# Altium footprint library HW_HOLLAND_NCDM_MONITOR_R1.PcbLib: 472 footprints (part 7 of 30)
Each footprint in its own frame and in the unit in brackets; x right, y up, seen from the top. Pads: shape width x height; smd on the part's side, far side on the other; paste and mask are expansions set on the pad; w line width, h text height; cw(c..) or ccw(c..) is an arc to the next point about the centre after c.
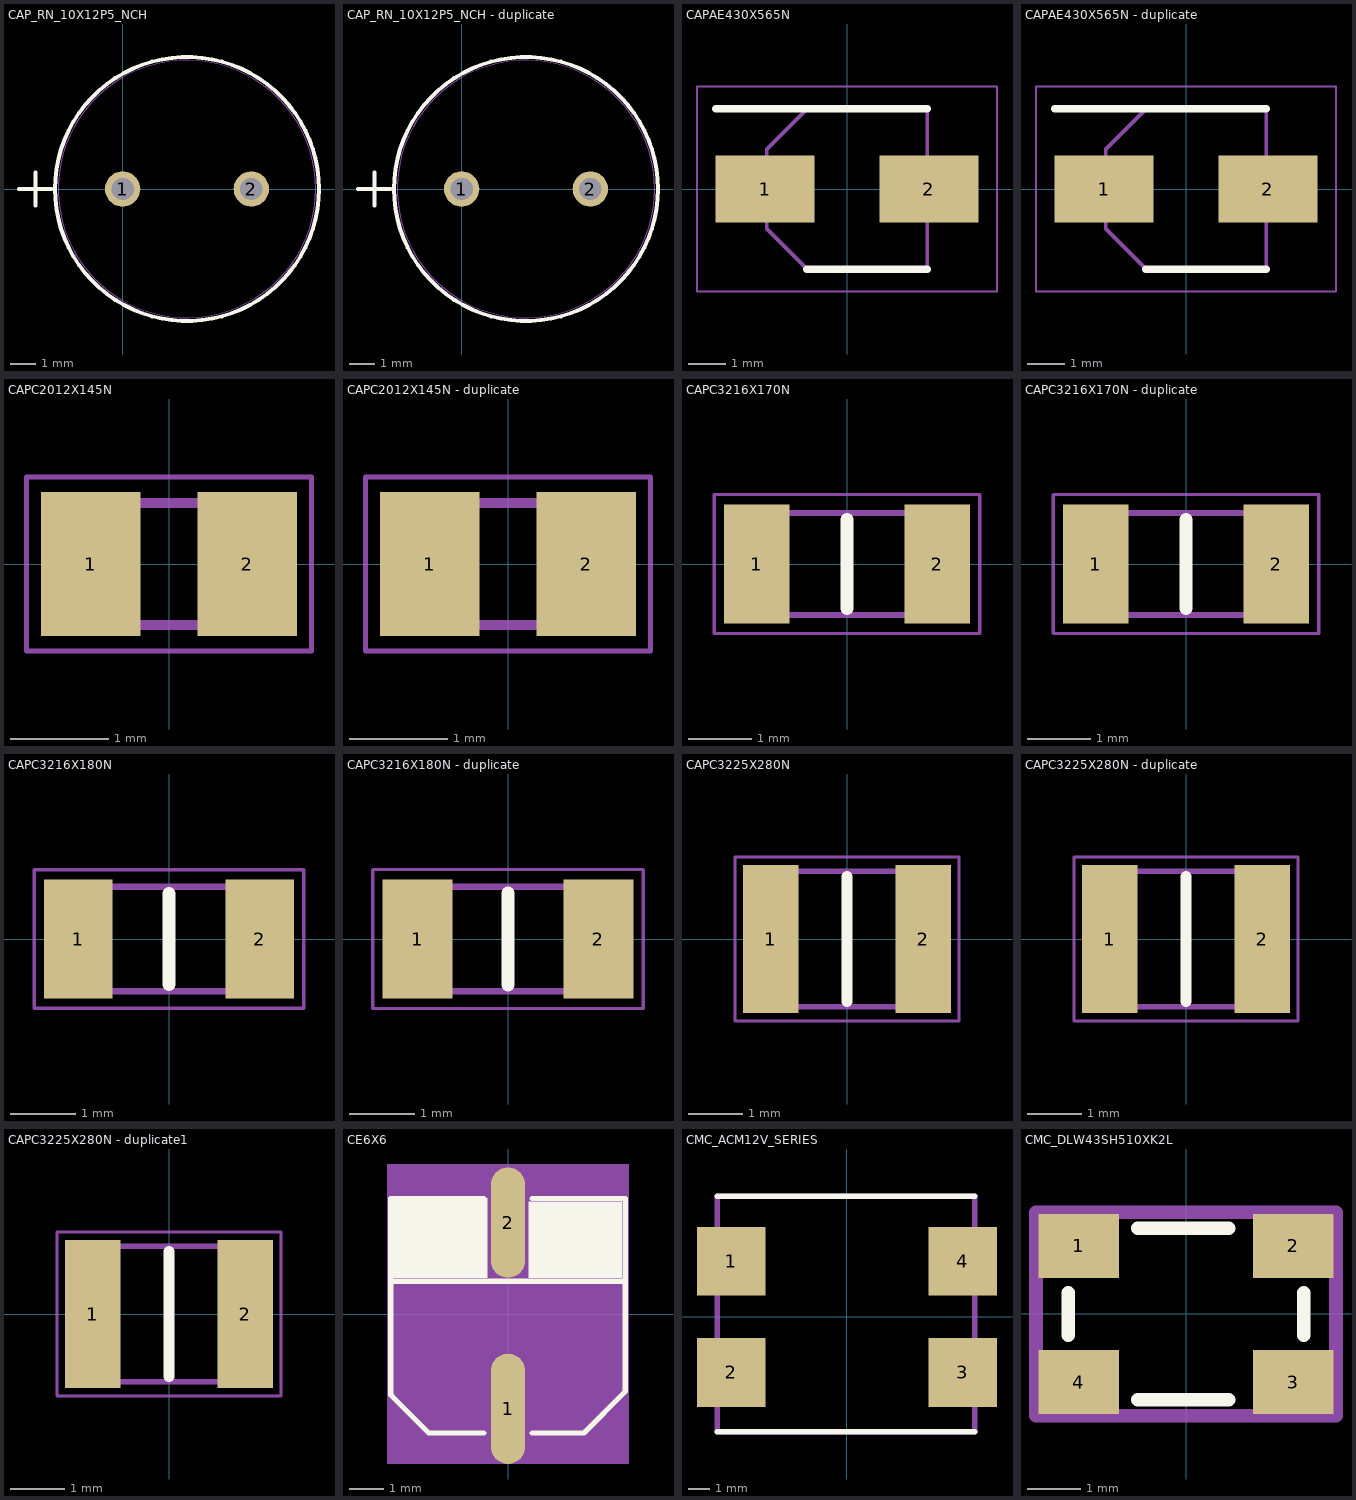
[diagram p6: the footprints below, top view; thin cyan lines are the x and y axes]

## CAP_RN_10X12P5_NCH [mil]
pads (2):
  round 54 hole 34 mask+0: 1(0,0) 2(196.85,0)
Top Overlay:
  circle w6: c98.43,0 r202
  lines w6: -158.57,0 -108.57,0 ; -133.57,-25 -133.57,25
Mechanical 13:
  circle w0: c98.43,0 r197
  lines w1: -158.57,0 -108.57,0 ; -133.57,-25 -133.57,25
3D body "UVY1H221MPD1TD.STEP": height 551.18, standoff -748.03, extent -98.42,-196.84 295.28,196.86

## CAP_RN_10X12P5_NCH - duplicate [mil]
pads (2):
  round 54 hole 34 mask+0: 1(0,0) 2(196.85,0)
Top Overlay:
  circle w6: c98.43,0 r202
  lines w6: -158.57,0 -108.57,0 ; -133.57,-25 -133.57,25
Mechanical 13:
  circle w0: c98.43,0 r197
  lines w1: -158.57,0 -108.57,0 ; -133.57,-25 -133.57,25
3D body "UVY1H221MPD1TD.STEP": height 551.18, standoff -748.03, extent -98.42,-196.84 295.28,196.86

## CAPAE430X565N [mm]
pads (2):
  rect 2.65x1.8 smd: 1(-2.2,0) 2(2.2,0)
Top Overlay:
  lines w0.2: -3.525,2.15 2.15,2.15 ; -1.075,-2.15 2.15,-2.15
Mechanical 13:
  lines w0.1: -2.15,-1.075 -1.075,-2.15 2.15,-2.15 2.15,2.15 -1.075,2.15 -2.15,1.075 -2.15,-1.075
Mechanical 15:
  lines w0.05: -4.025,-2.75 -4.025,2.75 4.025,2.75 4.025,-2.75 -4.025,-2.75
3D body "EDH106M016A9BAA.stp": height 5.66, standoff 0, extent -2.9,-2.3 2.3,2.2

## CAPAE430X565N - duplicate [mm]
pads (2):
  rect 2.65x1.8 smd: 1(-2.2,0) 2(2.2,0)
Top Overlay:
  lines w0.2: -3.525,2.15 2.15,2.15 ; -1.075,-2.15 2.15,-2.15
Mechanical 13:
  lines w0.1: -2.15,-1.075 -1.075,-2.15 2.15,-2.15 2.15,2.15 -1.075,2.15 -2.15,1.075 -2.15,-1.075
Mechanical 15:
  lines w0.05: -4.025,-2.75 -4.025,2.75 4.025,2.75 4.025,-2.75 -4.025,-2.75
3D body "EDH106M016A9BAA.stp": height 5.66, standoff 0, extent -2.9,-2.3 2.3,2.2

## CAPC2012X145N [mm]
pads (2):
  rect 1.02x1.47 smd: 1(-0.8,0) 2(0.8,0)
Mechanical 13:
  lines w0.1: -1,-0.625 1,-0.625 1,0.625 -1,0.625 -1,-0.625
Mechanical 15:
  lines w0.05: -1.46,-0.89 1.46,-0.89 1.46,0.89 -1.46,0.89 -1.46,-0.89
3D body "CC0805KKX5R8BB106.stp": height 1.45, standoff 0, extent -1,-0.625 1,0.625

## CAPC2012X145N - duplicate [mm]
pads (2):
  rect 1.02x1.47 smd: 1(-0.8,0) 2(0.8,0)
Mechanical 13:
  lines w0.1: -1,-0.625 1,-0.625 1,0.625 -1,0.625 -1,-0.625
Mechanical 15:
  lines w0.05: -1.46,-0.89 1.46,-0.89 1.46,0.89 -1.46,0.89 -1.46,-0.89
3D body "CC0805KKX5R8BB106.stp": height 1.45, standoff 0, extent -1,-0.625 1,0.625

## CAPC3216X170N [mm]
pads (2):
  rect 1.03x1.87 smd: 1(-1.42,0) 2(1.42,0)
Top Overlay:
  lines w0.2: 0,-0.7 0,0.7
Mechanical 13:
  lines w0.1: -1.6,-0.8 1.6,-0.8 1.6,0.8 -1.6,0.8 -1.6,-0.8
Mechanical 15:
  lines w0.05: -2.085,-1.09 2.085,-1.09 2.085,1.09 -2.085,1.09 -2.085,-1.09
3D body "VJ1206Y104JXAAT.stp": height 1.7, standoff 0, extent -1.6,-0.8 1.6,0.8

## CAPC3216X170N - duplicate [mm]
pads (2):
  rect 1.03x1.87 smd: 1(-1.42,0) 2(1.42,0)
Top Overlay:
  lines w0.2: 0,-0.7 0,0.7
Mechanical 13:
  lines w0.1: -1.6,-0.8 1.6,-0.8 1.6,0.8 -1.6,0.8 -1.6,-0.8
Mechanical 15:
  lines w0.05: -2.085,-1.09 2.085,-1.09 2.085,1.09 -2.085,1.09 -2.085,-1.09
3D body "VJ1206Y104JXAAT.stp": height 1.7, standoff 0, extent -1.6,-0.8 1.6,0.8

## CAPC3216X180N [mm]
height 3.5
pads (2):
  rect 1.05x1.82 smd: 1(-1.39,0) 2(1.39,0)
Top Overlay:
  lines w0.2: 0,-0.7 0,0.7
Mechanical 13:
  lines w0.1: -1.6,-0.8 -1.6,0.8 1.6,0.8 1.6,-0.8 -1.6,-0.8
Mechanical 15:
  lines w0.05: -2.065,-1.06 -2.065,1.06 2.065,1.06 2.065,-1.06 -2.065,-1.06
3D body "CL31A226KAHNNNE.stp": height 1.8, standoff 0, extent -1.6,-0.8 1.6,0.8

## CAPC3216X180N - duplicate [mm]
pads (2):
  rect 1.07x1.82 smd: 1(-1.38,0) 2(1.38,0)
Top Overlay:
  lines w0.2: 0,-0.7 0,0.7
Mechanical 13:
  lines w0.1: -1.6,-0.8 1.6,-0.8 1.6,0.8 -1.6,0.8 -1.6,-0.8
Mechanical 15:
  lines w0.05: -2.065,-1.06 2.065,-1.06 2.065,1.06 -2.065,1.06 -2.065,-1.06
3D body "GRM31CR71H475KA12L.stp": height 1.8, standoff 0, extent -1.6,-0.8 1.6,0.8

## CAPC3225X280N [mm]
pads (2):
  rect 1.02x2.72 smd: 1(-1.4,0) 2(1.4,0)
Top Overlay:
  lines w0.2: 0,-1.15 0,1.15
Mechanical 13:
  lines w0.1: -1.6,-1.25 1.6,-1.25 1.6,1.25 -1.6,1.25 -1.6,-1.25
Mechanical 15:
  lines w0.05: -2.06,-1.51 2.06,-1.51 2.06,1.51 -2.06,1.51 -2.06,-1.51
3D body "C1210C682MGRAC7800.stp": height 2.8, standoff 0, extent -1.7,-1.35 1.7,1.35

## CAPC3225X280N - duplicate [mm]
pads (2):
  rect 1.02x2.72 smd: 1(-1.4,0) 2(1.4,0)
Top Overlay:
  lines w0.2: 0,-1.15 0,1.15
Mechanical 13:
  lines w0.1: -1.6,-1.25 1.6,-1.25 1.6,1.25 -1.6,1.25 -1.6,-1.25
Mechanical 15:
  lines w0.05: -2.06,-1.51 2.06,-1.51 2.06,1.51 -2.06,1.51 -2.06,-1.51
3D body "C1210C682MGRAC7800.stp": height 2.8, standoff 0, extent -1.7,-1.35 1.7,1.35

## CAPC3225X280N - duplicate1 [mm]
pads (2):
  rect 1.02x2.72 smd: 1(-1.4,0) 2(1.4,0)
Top Overlay:
  lines w0.2: 0,-1.15 0,1.15
Mechanical 13:
  lines w0.1: -1.6,-1.25 1.6,-1.25 1.6,1.25 -1.6,1.25 -1.6,-1.25
Mechanical 15:
  lines w0.05: -2.06,-1.51 2.06,-1.51 2.06,1.51 -2.06,1.51 -2.06,-1.51
3D body "C1210C682MGRAC7800.stp": height 2.8, standoff 0, extent -1.7,-1.35 1.7,1.35

## CE6X6 [mm]
pads (2):
  oval 1x3.2 smd: 1(0,-2.75) 2(0,2.65)
Top Overlay:
  dashed: 0.6,3.25 0.6,1.05 3.3,1.05 3.3,3.25
  dashed: -3.4,3.35 -3.4,1.05 -0.6,1.05 -0.6,3.35
  lines w0.025: -3.4,0.95 3.4,0.95 ; -0.7,-3.45 -2.3,-3.45 -3.4,-2.25 -3.4,3.35 -0.7,3.35 ; 0.7,-3.45 2.3,-3.45 3.4,-2.25 3.4,3.35 0.7,3.35
  lines w0.152: -3.4,0.95 3.4,0.95 ; -0.7,-3.45 -2.3,-3.45 -3.4,-2.35 -3.4,3.35 -0.7,3.35 ; 0.7,-3.45 2.2,-3.45 3.4,-2.25 3.4,3.35 0.7,3.35
  text ".Designator" at 0.636,0.212 h0.64
Top 3D Body:
  region: -3.5,4.35 3.5,4.35 3.5,-4.35 -3.5,-4.35
Mechanical 17:
  text "1" at 3.251,-2.75 h4.06
  text "2" at 3.251,2.65 h4.06
3D body: height 3.81, standoff 0, extent -3.5,-4.35 3.5,4.35

## CMC_ACM12V_SERIES [mm]
height 0.52
pads (4):
  rect 3.2x3.2 smd: 1(-5.4,2.6) 2(-5.4,-2.6) 3(5.4,-2.6) 4(5.4,2.6)
Top Overlay:
  lines w0.254: -6.048,-5.371 5.952,-5.371 ; -6.048,5.629 5.952,5.629
Top Designator:
  lines w0.254: -6.048,-5.371 -6.048,5.629 5.952,5.629 5.952,-5.371 -6.048,-5.371
  text ".Designator" at -19.044,-1.27 h3.81
3D body "acm12v.step": height 5.65, standoff 0.1, extent -6.048,-5.371 5.952,5.629

## CMC_DLW43SH510XK2L [mm]
height 3.5
pads (4):
  rect 1.5x1.2 smd: 1(-2,1.27) 2(2,1.27) 3(2,-1.27) 4(-2,-1.27)
Top Overlay:
  lines w0.254: -2.2,-0.4 -2.2,0.4 ; -0.9,-1.6 0.8,-1.6 ; -0.9,1.6 0.8,1.6 ; 2.2,-0.4 2.2,0.4
Top Designator:
  lines w0.254: -2.8,-1.9 -2.8,1.9 2.8,1.9 2.8,-1.9 -2.8,-1.9
  text ".Designator" at -7.618,-0.508 h1.52
3D body "User Library-DLW43S.step": height 2.65, standoff 0.05, extent -2.25,-1.6 2.25,1.6